# Altium footprint library CONN_HDR_MINI_ST.PcbLib: 116 footprints (part 9 of 10)
Each footprint in its own frame and in the unit in brackets; x right, y up, seen from the top. Pads: shape width x height; smd on the part's side, far side on the other; paste and mask are expansions set on the pad; w line width, h text height; cw(c..) or ccw(c..) is an arc to the next point about the centre after c.
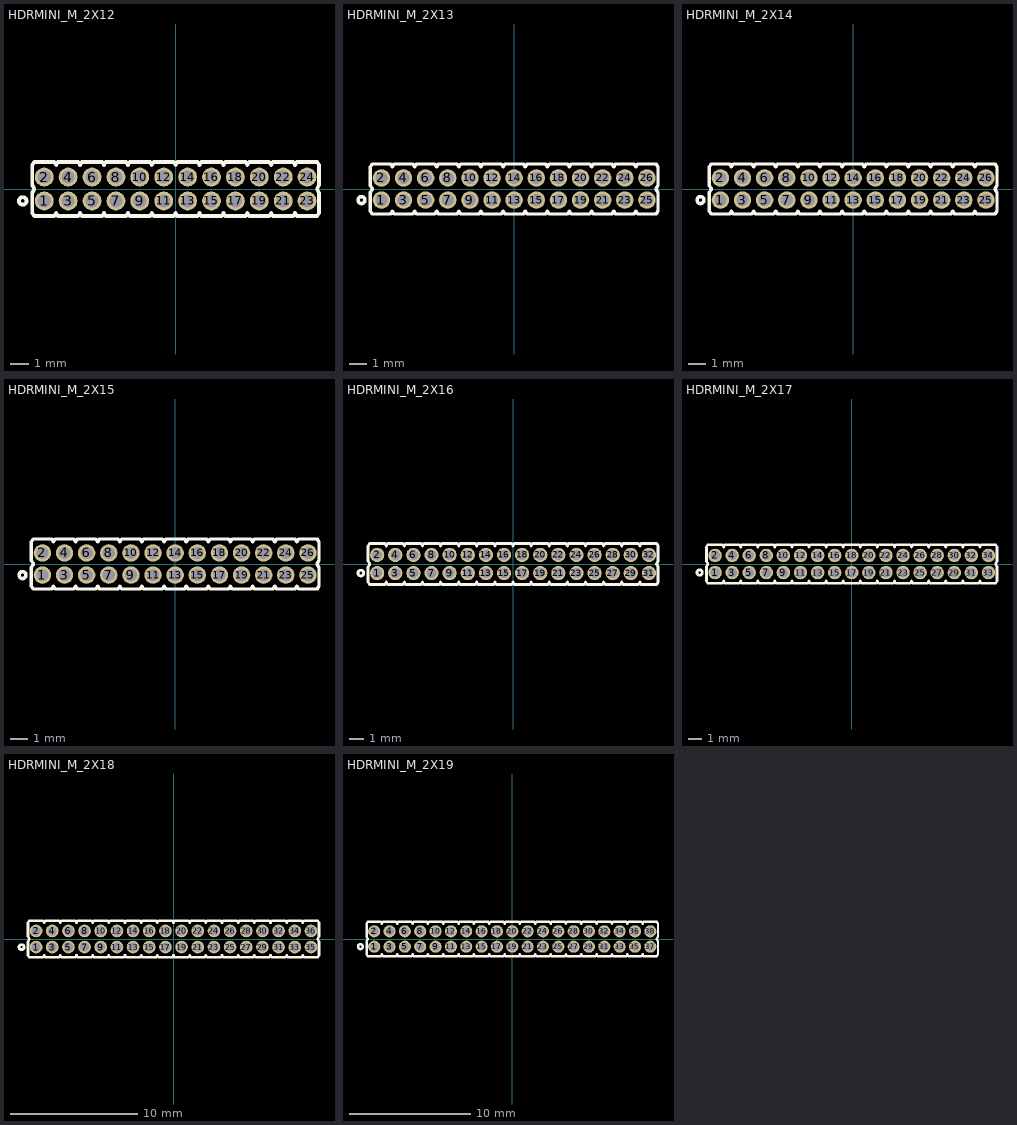
[diagram p8: the footprints below, top view; thin cyan lines are the x and y axes]

## HDRMINI_M_2X12 [mm] "mini header (50mil pitch)"
pads (24):
  round 1 hole 0.7 mask+0.05: 1(-6.985,-0.635) 2(-6.985,0.635) 3(-5.715,-0.635) 4(-5.715,0.635) 5(-4.445,-0.635) 6(-4.445,0.635) 7(-3.175,-0.635) 8(-3.175,0.635) 9(-1.905,-0.635) 10(-1.905,0.635) 11(-0.635,-0.635) 12(-0.635,0.635) 13(0.635,-0.635) 14(0.635,0.635) 15(1.905,-0.635) 16(1.905,0.635) 17(3.175,-0.635) 18(3.175,0.635) 19(4.445,-0.635) 20(4.445,0.635) 21(5.715,-0.635) 22(5.715,0.635) 23(6.985,-0.635) 24(6.985,0.635)
Top Overlay:
  circle w0.2: c-8.128,-0.635 r0.2
  lines w0.2: -7.521,-0.035 -7.62,-0.2 -7.62,-1.27 -7.521,-1.435 -6.449,-1.435 -6.35,-1.27 -6.251,-1.435 -5.179,-1.435 -5.08,-1.27 -4.981,-1.435 -3.909,-1.435 -3.81,-1.27 -3.711,-1.435 -2.639,-1.435 -2.54,-1.27 -2.441,-1.435 -1.369,-1.435 -1.27,-1.27 -1.171,-1.435 -0.099,-1.435 0,-1.27 0.099,-1.435 1.171,-1.435 1.27,-1.27 1.369,-1.435 2.441,-1.435 2.54,-1.27 2.639,-1.435 3.711,-1.435 3.81,-1.27 3.909,-1.435 4.981,-1.435 5.08,-1.27 5.179,-1.435 6.251,-1.435 6.35,-1.27 6.449,-1.435 7.521,-1.435 7.62,-1.27 7.62,-0.2 7.521,-0.035 ; -7.521,0.035 -7.62,0.2 -7.62,1.27 -7.521,1.435 -6.449,1.435 -6.35,1.27 -6.251,1.435 -5.179,1.435 -5.08,1.27 -4.981,1.435 -3.909,1.435 -3.81,1.27 -3.711,1.435 -2.639,1.435 -2.54,1.27 -2.441,1.435 -1.369,1.435 -1.27,1.27 -1.171,1.435 -0.099,1.435 0,1.27 0.099,1.435 1.171,1.435 1.27,1.27 1.369,1.435 2.441,1.435 2.54,1.27 2.639,1.435 3.711,1.435 3.81,1.27 3.909,1.435 4.981,1.435 5.08,1.27 5.179,1.435 6.251,1.435 6.35,1.27 6.449,1.435 7.521,1.435 7.62,1.27 7.62,0.2 7.521,0.035
3D body: height 7.3, standoff -2.5, extent -7.185,0.435 -6.785,0.835
3D body: height 2.8, standoff 0, extent -7.62,0 -6.35,1.27
3D body: height 7.3, standoff -2.5, extent -5.915,0.435 -5.515,0.835
3D body: height 2.8, standoff 0, extent -6.35,0 -5.08,1.27
3D body: height 7.3, standoff -2.5, extent -7.185,-0.835 -6.785,-0.435
3D body: height 2.8, standoff 0, extent -7.62,-1.27 -6.35,0
3D body: height 7.3, standoff -2.5, extent -5.915,-0.835 -5.515,-0.435
3D body: height 2.8, standoff 0, extent -6.35,-1.27 -5.08,0
3D body: height 7.3, standoff -2.5, extent -4.645,0.435 -4.245,0.835
3D body: height 2.8, standoff 0, extent -5.08,0 -3.81,1.27
3D body: height 7.3, standoff -2.5, extent -3.375,0.435 -2.975,0.835
3D body: height 2.8, standoff 0, extent -3.81,0 -2.54,1.27
3D body: height 7.3, standoff -2.5, extent -4.645,-0.835 -4.245,-0.435
3D body: height 2.8, standoff 0, extent -5.08,-1.27 -3.81,0
3D body: height 7.3, standoff -2.5, extent -3.375,-0.835 -2.975,-0.435
3D body: height 2.8, standoff 0, extent -3.81,-1.27 -2.54,0
3D body: height 7.3, standoff -2.5, extent -2.105,0.435 -1.705,0.835
3D body: height 2.8, standoff 0, extent -2.54,0 -1.27,1.27
3D body: height 7.3, standoff -2.5, extent -0.835,0.435 -0.435,0.835
3D body: height 2.8, standoff 0, extent -1.27,0 0,1.27
3D body: height 7.3, standoff -2.5, extent -2.105,-0.835 -1.705,-0.435
3D body: height 2.8, standoff 0, extent -2.54,-1.27 -1.27,0
3D body: height 7.3, standoff -2.5, extent -0.835,-0.835 -0.435,-0.435
3D body: height 2.8, standoff 0, extent -1.27,-1.27 0,0
3D body: height 7.3, standoff -2.5, extent 0.435,0.435 0.835,0.835
3D body: height 2.8, standoff 0, extent 0,0 1.27,1.27
3D body: height 7.3, standoff -2.5, extent 1.705,0.435 2.105,0.835
3D body: height 2.8, standoff 0, extent 1.27,0 2.54,1.27
3D body: height 7.3, standoff -2.5, extent 0.435,-0.835 0.835,-0.435
3D body: height 2.8, standoff 0, extent 0,-1.27 1.27,0
3D body: height 7.3, standoff -2.5, extent 1.705,-0.835 2.105,-0.435
3D body: height 2.8, standoff 0, extent 1.27,-1.27 2.54,0
3D body: height 7.3, standoff -2.5, extent 2.975,0.435 3.375,0.835
3D body: height 2.8, standoff 0, extent 2.54,0 3.81,1.27
3D body: height 7.3, standoff -2.5, extent 4.245,0.435 4.645,0.835
3D body: height 2.8, standoff 0, extent 3.81,0 5.08,1.27
3D body: height 7.3, standoff -2.5, extent 2.975,-0.835 3.375,-0.435
3D body: height 2.8, standoff 0, extent 2.54,-1.27 3.81,0
3D body: height 7.3, standoff -2.5, extent 4.245,-0.835 4.645,-0.435
3D body: height 2.8, standoff 0, extent 3.81,-1.27 5.08,0
3D body: height 7.3, standoff -2.5, extent 5.515,0.435 5.915,0.835
3D body: height 2.8, standoff 0, extent 5.08,0 6.35,1.27
3D body: height 7.3, standoff -2.5, extent 6.785,0.435 7.185,0.835
3D body: height 2.8, standoff 0, extent 6.35,0 7.62,1.27
3D body: height 7.3, standoff -2.5, extent 5.515,-0.835 5.915,-0.435
3D body: height 2.8, standoff 0, extent 5.08,-1.27 6.35,0
3D body: height 7.3, standoff -2.5, extent 6.785,-0.835 7.185,-0.435
3D body: height 2.8, standoff 0, extent 6.35,-1.27 7.62,0

## HDRMINI_M_2X13 [mm] "mini header (50mil pitch)"
pads (26):
  round 1 hole 0.7 mask+0.05: 1(-7.62,-0.635) 2(-7.62,0.635) 3(-6.35,-0.635) 4(-6.35,0.635) 5(-5.08,-0.635) 6(-5.08,0.635) 7(-3.81,-0.635) 8(-3.81,0.635) 9(-2.54,-0.635) 10(-2.54,0.635) 11(-1.27,-0.635) 12(-1.27,0.635) 13(0,-0.635) 14(0,0.635) 15(1.27,-0.635) 16(1.27,0.635) 17(2.54,-0.635) 18(2.54,0.635) 19(3.81,-0.635) 20(3.81,0.635) 21(5.08,-0.635) 22(5.08,0.635) 23(6.35,-0.635) 24(6.35,0.635) 25(7.62,-0.635) 26(7.62,0.635)
Top Overlay:
  circle w0.2: c-8.763,-0.635 r0.2
  lines w0.2: -8.156,-0.035 -8.255,-0.2 -8.255,-1.27 -8.156,-1.435 -7.084,-1.435 -6.985,-1.27 -6.886,-1.435 -5.814,-1.435 -5.715,-1.27 -5.616,-1.435 -4.544,-1.435 -4.445,-1.27 -4.346,-1.435 -3.274,-1.435 -3.175,-1.27 -3.076,-1.435 -2.004,-1.435 -1.905,-1.27 -1.806,-1.435 -0.734,-1.435 -0.635,-1.27 -0.536,-1.435 0.536,-1.435 0.635,-1.27 0.734,-1.435 1.806,-1.435 1.905,-1.27 2.004,-1.435 3.076,-1.435 3.175,-1.27 3.274,-1.435 4.346,-1.435 4.445,-1.27 4.544,-1.435 5.616,-1.435 5.715,-1.27 5.814,-1.435 6.886,-1.435 6.985,-1.27 7.084,-1.435 8.156,-1.435 8.255,-1.27 8.255,-0.2 8.156,-0.035 ; -8.156,0.035 -8.255,0.2 -8.255,1.27 -8.156,1.435 -7.084,1.435 -6.985,1.27 -6.886,1.435 -5.814,1.435 -5.715,1.27 -5.616,1.435 -4.544,1.435 -4.445,1.27 -4.346,1.435 -3.274,1.435 -3.175,1.27 -3.076,1.435 -2.004,1.435 -1.905,1.27 -1.806,1.435 -0.734,1.435 -0.635,1.27 -0.536,1.435 0.536,1.435 0.635,1.27 0.734,1.435 1.806,1.435 1.905,1.27 2.004,1.435 3.076,1.435 3.175,1.27 3.274,1.435 4.346,1.435 4.445,1.27 4.544,1.435 5.616,1.435 5.715,1.27 5.814,1.435 6.886,1.435 6.985,1.27 7.084,1.435 8.156,1.435 8.255,1.27 8.255,0.2 8.156,0.035
3D body: height 7.3, standoff -2.5, extent -7.82,0.435 -7.42,0.835
3D body: height 2.8, standoff 0, extent -8.255,0 -6.985,1.27
3D body: height 7.3, standoff -2.5, extent -6.55,0.435 -6.15,0.835
3D body: height 2.8, standoff 0, extent -6.985,0 -5.715,1.27
3D body: height 7.3, standoff -2.5, extent -7.82,-0.835 -7.42,-0.435
3D body: height 2.8, standoff 0, extent -8.255,-1.27 -6.985,0
3D body: height 7.3, standoff -2.5, extent -6.55,-0.835 -6.15,-0.435
3D body: height 2.8, standoff 0, extent -6.985,-1.27 -5.715,0
3D body: height 7.3, standoff -2.5, extent -5.28,0.435 -4.88,0.835
3D body: height 2.8, standoff 0, extent -5.715,0 -4.445,1.27
3D body: height 7.3, standoff -2.5, extent -4.01,0.435 -3.61,0.835
3D body: height 2.8, standoff 0, extent -4.445,0 -3.175,1.27
3D body: height 7.3, standoff -2.5, extent -5.28,-0.835 -4.88,-0.435
3D body: height 2.8, standoff 0, extent -5.715,-1.27 -4.445,0
3D body: height 7.3, standoff -2.5, extent -4.01,-0.835 -3.61,-0.435
3D body: height 2.8, standoff 0, extent -4.445,-1.27 -3.175,0
3D body: height 7.3, standoff -2.5, extent -2.74,0.435 -2.34,0.835
3D body: height 2.8, standoff 0, extent -3.175,0 -1.905,1.27
3D body: height 7.3, standoff -2.5, extent -1.47,0.435 -1.07,0.835
3D body: height 2.8, standoff 0, extent -1.905,0 -0.635,1.27
3D body: height 7.3, standoff -2.5, extent -2.74,-0.835 -2.34,-0.435
3D body: height 2.8, standoff 0, extent -3.175,-1.27 -1.905,0
3D body: height 7.3, standoff -2.5, extent -1.47,-0.835 -1.07,-0.435
3D body: height 2.8, standoff 0, extent -1.905,-1.27 -0.635,0
3D body: height 7.3, standoff -2.5, extent -0.2,0.435 0.2,0.835
3D body: height 2.8, standoff 0, extent -0.635,0 0.635,1.27
3D body: height 7.3, standoff -2.5, extent 1.07,0.435 1.47,0.835
3D body: height 2.8, standoff 0, extent 0.635,0 1.905,1.27
3D body: height 7.3, standoff -2.5, extent -0.2,-0.835 0.2,-0.435
3D body: height 2.8, standoff 0, extent -0.635,-1.27 0.635,0
3D body: height 7.3, standoff -2.5, extent 1.07,-0.835 1.47,-0.435
3D body: height 2.8, standoff 0, extent 0.635,-1.27 1.905,0
3D body: height 7.3, standoff -2.5, extent 2.34,0.435 2.74,0.835
3D body: height 2.8, standoff 0, extent 1.905,0 3.175,1.27
3D body: height 7.3, standoff -2.5, extent 3.61,0.435 4.01,0.835
3D body: height 2.8, standoff 0, extent 3.175,0 4.445,1.27
3D body: height 7.3, standoff -2.5, extent 2.34,-0.835 2.74,-0.435
3D body: height 2.8, standoff 0, extent 1.905,-1.27 3.175,0
3D body: height 7.3, standoff -2.5, extent 3.61,-0.835 4.01,-0.435
3D body: height 2.8, standoff 0, extent 3.175,-1.27 4.445,0
3D body: height 7.3, standoff -2.5, extent 4.88,0.435 5.28,0.835
3D body: height 2.8, standoff 0, extent 4.445,0 5.715,1.27
3D body: height 7.3, standoff -2.5, extent 6.15,0.435 6.55,0.835
3D body: height 2.8, standoff 0, extent 5.715,0 6.985,1.27
3D body: height 7.3, standoff -2.5, extent 4.88,-0.835 5.28,-0.435
3D body: height 2.8, standoff 0, extent 4.445,-1.27 5.715,0
3D body: height 7.3, standoff -2.5, extent 6.15,-0.835 6.55,-0.435
3D body: height 2.8, standoff 0, extent 5.715,-1.27 6.985,0
3D body: height 7.3, standoff -2.5, extent 7.42,0.435 7.82,0.835
3D body: height 2.8, standoff 0, extent 6.985,0 8.255,1.27
3D body: height 7.3, standoff -2.5, extent 7.42,-0.835 7.82,-0.435
3D body: height 2.8, standoff 0, extent 6.985,-1.27 8.255,0

## HDRMINI_M_2X14 [mm] "mini header (50mil pitch)"
pads (26):
  round 1 hole 0.7 mask+0.05: 1(-7.62,-0.635) 2(-7.62,0.635) 3(-6.35,-0.635) 4(-6.35,0.635) 5(-5.08,-0.635) 6(-5.08,0.635) 7(-3.81,-0.635) 8(-3.81,0.635) 9(-2.54,-0.635) 10(-2.54,0.635) 11(-1.27,-0.635) 12(-1.27,0.635) 13(0,-0.635) 14(0,0.635) 15(1.27,-0.635) 16(1.27,0.635) 17(2.54,-0.635) 18(2.54,0.635) 19(3.81,-0.635) 20(3.81,0.635) 21(5.08,-0.635) 22(5.08,0.635) 23(6.35,-0.635) 24(6.35,0.635) 25(7.62,-0.635) 26(7.62,0.635)
Top Overlay:
  circle w0.2: c-8.763,-0.635 r0.2
  lines w0.2: -8.156,-0.035 -8.255,-0.2 -8.255,-1.27 -8.156,-1.435 -7.084,-1.435 -6.985,-1.27 -6.886,-1.435 -5.814,-1.435 -5.715,-1.27 -5.616,-1.435 -4.544,-1.435 -4.445,-1.27 -4.346,-1.435 -3.274,-1.435 -3.175,-1.27 -3.076,-1.435 -2.004,-1.435 -1.905,-1.27 -1.806,-1.435 -0.734,-1.435 -0.635,-1.27 -0.536,-1.435 0.536,-1.435 0.635,-1.27 0.734,-1.435 1.806,-1.435 1.905,-1.27 2.004,-1.435 3.076,-1.435 3.175,-1.27 3.274,-1.435 4.346,-1.435 4.445,-1.27 4.544,-1.435 5.616,-1.435 5.715,-1.27 5.814,-1.435 6.886,-1.435 6.985,-1.27 7.084,-1.435 8.156,-1.435 8.255,-1.27 8.255,-0.2 8.156,-0.035 ; -8.156,0.035 -8.255,0.2 -8.255,1.27 -8.156,1.435 -7.084,1.435 -6.985,1.27 -6.886,1.435 -5.814,1.435 -5.715,1.27 -5.616,1.435 -4.544,1.435 -4.445,1.27 -4.346,1.435 -3.274,1.435 -3.175,1.27 -3.076,1.435 -2.004,1.435 -1.905,1.27 -1.806,1.435 -0.734,1.435 -0.635,1.27 -0.536,1.435 0.536,1.435 0.635,1.27 0.734,1.435 1.806,1.435 1.905,1.27 2.004,1.435 3.076,1.435 3.175,1.27 3.274,1.435 4.346,1.435 4.445,1.27 4.544,1.435 5.616,1.435 5.715,1.27 5.814,1.435 6.886,1.435 6.985,1.27 7.084,1.435 8.156,1.435 8.255,1.27 8.255,0.2 8.156,0.035
3D body: height 7.3, standoff -2.5, extent -7.82,0.435 -7.42,0.835
3D body: height 2.8, standoff 0, extent -8.255,0 -6.985,1.27
3D body: height 7.3, standoff -2.5, extent -6.55,0.435 -6.15,0.835
3D body: height 2.8, standoff 0, extent -6.985,0 -5.715,1.27
3D body: height 7.3, standoff -2.5, extent -7.82,-0.835 -7.42,-0.435
3D body: height 2.8, standoff 0, extent -8.255,-1.27 -6.985,0
3D body: height 7.3, standoff -2.5, extent -6.55,-0.835 -6.15,-0.435
3D body: height 2.8, standoff 0, extent -6.985,-1.27 -5.715,0
3D body: height 7.3, standoff -2.5, extent -5.28,0.435 -4.88,0.835
3D body: height 2.8, standoff 0, extent -5.715,0 -4.445,1.27
3D body: height 7.3, standoff -2.5, extent -4.01,0.435 -3.61,0.835
3D body: height 2.8, standoff 0, extent -4.445,0 -3.175,1.27
3D body: height 7.3, standoff -2.5, extent -5.28,-0.835 -4.88,-0.435
3D body: height 2.8, standoff 0, extent -5.715,-1.27 -4.445,0
3D body: height 7.3, standoff -2.5, extent -4.01,-0.835 -3.61,-0.435
3D body: height 2.8, standoff 0, extent -4.445,-1.27 -3.175,0
3D body: height 7.3, standoff -2.5, extent -2.74,0.435 -2.34,0.835
3D body: height 2.8, standoff 0, extent -3.175,0 -1.905,1.27
3D body: height 7.3, standoff -2.5, extent -1.47,0.435 -1.07,0.835
3D body: height 2.8, standoff 0, extent -1.905,0 -0.635,1.27
3D body: height 7.3, standoff -2.5, extent -2.74,-0.835 -2.34,-0.435
3D body: height 2.8, standoff 0, extent -3.175,-1.27 -1.905,0
3D body: height 7.3, standoff -2.5, extent -1.47,-0.835 -1.07,-0.435
3D body: height 2.8, standoff 0, extent -1.905,-1.27 -0.635,0
3D body: height 7.3, standoff -2.5, extent -0.2,0.435 0.2,0.835
3D body: height 2.8, standoff 0, extent -0.635,0 0.635,1.27
3D body: height 7.3, standoff -2.5, extent 1.07,0.435 1.47,0.835
3D body: height 2.8, standoff 0, extent 0.635,0 1.905,1.27
3D body: height 7.3, standoff -2.5, extent -0.2,-0.835 0.2,-0.435
3D body: height 2.8, standoff 0, extent -0.635,-1.27 0.635,0
3D body: height 7.3, standoff -2.5, extent 1.07,-0.835 1.47,-0.435
3D body: height 2.8, standoff 0, extent 0.635,-1.27 1.905,0
3D body: height 7.3, standoff -2.5, extent 2.34,0.435 2.74,0.835
3D body: height 2.8, standoff 0, extent 1.905,0 3.175,1.27
3D body: height 7.3, standoff -2.5, extent 3.61,0.435 4.01,0.835
3D body: height 2.8, standoff 0, extent 3.175,0 4.445,1.27
3D body: height 7.3, standoff -2.5, extent 2.34,-0.835 2.74,-0.435
3D body: height 2.8, standoff 0, extent 1.905,-1.27 3.175,0
3D body: height 7.3, standoff -2.5, extent 3.61,-0.835 4.01,-0.435
3D body: height 2.8, standoff 0, extent 3.175,-1.27 4.445,0
3D body: height 7.3, standoff -2.5, extent 4.88,0.435 5.28,0.835
3D body: height 2.8, standoff 0, extent 4.445,0 5.715,1.27
3D body: height 7.3, standoff -2.5, extent 6.15,0.435 6.55,0.835
3D body: height 2.8, standoff 0, extent 5.715,0 6.985,1.27
3D body: height 7.3, standoff -2.5, extent 4.88,-0.835 5.28,-0.435
3D body: height 2.8, standoff 0, extent 4.445,-1.27 5.715,0
3D body: height 7.3, standoff -2.5, extent 6.15,-0.835 6.55,-0.435
3D body: height 2.8, standoff 0, extent 5.715,-1.27 6.985,0
3D body: height 7.3, standoff -2.5, extent 7.42,0.435 7.82,0.835
3D body: height 2.8, standoff 0, extent 6.985,0 8.255,1.27
3D body: height 7.3, standoff -2.5, extent 7.42,-0.835 7.82,-0.435
3D body: height 2.8, standoff 0, extent 6.985,-1.27 8.255,0

## HDRMINI_M_2X15 [mm] "mini header (50mil pitch)"
pads (26):
  round 1 hole 0.7 mask+0.05: 1(-7.62,-0.635) 2(-7.62,0.635) 3(-6.35,-0.635) 4(-6.35,0.635) 5(-5.08,-0.635) 6(-5.08,0.635) 7(-3.81,-0.635) 8(-3.81,0.635) 9(-2.54,-0.635) 10(-2.54,0.635) 11(-1.27,-0.635) 12(-1.27,0.635) 13(0,-0.635) 14(0,0.635) 15(1.27,-0.635) 16(1.27,0.635) 17(2.54,-0.635) 18(2.54,0.635) 19(3.81,-0.635) 20(3.81,0.635) 21(5.08,-0.635) 22(5.08,0.635) 23(6.35,-0.635) 24(6.35,0.635) 25(7.62,-0.635) 26(7.62,0.635)
Top Overlay:
  circle w0.2: c-8.763,-0.635 r0.2
  lines w0.2: -8.156,-0.035 -8.255,-0.2 -8.255,-1.27 -8.156,-1.435 -7.084,-1.435 -6.985,-1.27 -6.886,-1.435 -5.814,-1.435 -5.715,-1.27 -5.616,-1.435 -4.544,-1.435 -4.445,-1.27 -4.346,-1.435 -3.274,-1.435 -3.175,-1.27 -3.076,-1.435 -2.004,-1.435 -1.905,-1.27 -1.806,-1.435 -0.734,-1.435 -0.635,-1.27 -0.536,-1.435 0.536,-1.435 0.635,-1.27 0.734,-1.435 1.806,-1.435 1.905,-1.27 2.004,-1.435 3.076,-1.435 3.175,-1.27 3.274,-1.435 4.346,-1.435 4.445,-1.27 4.544,-1.435 5.616,-1.435 5.715,-1.27 5.814,-1.435 6.886,-1.435 6.985,-1.27 7.084,-1.435 8.156,-1.435 8.255,-1.27 8.255,-0.2 8.156,-0.035 ; -8.156,0.035 -8.255,0.2 -8.255,1.27 -8.156,1.435 -7.084,1.435 -6.985,1.27 -6.886,1.435 -5.814,1.435 -5.715,1.27 -5.616,1.435 -4.544,1.435 -4.445,1.27 -4.346,1.435 -3.274,1.435 -3.175,1.27 -3.076,1.435 -2.004,1.435 -1.905,1.27 -1.806,1.435 -0.734,1.435 -0.635,1.27 -0.536,1.435 0.536,1.435 0.635,1.27 0.734,1.435 1.806,1.435 1.905,1.27 2.004,1.435 3.076,1.435 3.175,1.27 3.274,1.435 4.346,1.435 4.445,1.27 4.544,1.435 5.616,1.435 5.715,1.27 5.814,1.435 6.886,1.435 6.985,1.27 7.084,1.435 8.156,1.435 8.255,1.27 8.255,0.2 8.156,0.035
3D body: height 7.3, standoff -2.5, extent -7.82,0.435 -7.42,0.835
3D body: height 2.8, standoff 0, extent -8.255,0 -6.985,1.27
3D body: height 7.3, standoff -2.5, extent -6.55,0.435 -6.15,0.835
3D body: height 2.8, standoff 0, extent -6.985,0 -5.715,1.27
3D body: height 7.3, standoff -2.5, extent -7.82,-0.835 -7.42,-0.435
3D body: height 2.8, standoff 0, extent -8.255,-1.27 -6.985,0
3D body: height 7.3, standoff -2.5, extent -6.55,-0.835 -6.15,-0.435
3D body: height 2.8, standoff 0, extent -6.985,-1.27 -5.715,0
3D body: height 7.3, standoff -2.5, extent -5.28,0.435 -4.88,0.835
3D body: height 2.8, standoff 0, extent -5.715,0 -4.445,1.27
3D body: height 7.3, standoff -2.5, extent -4.01,0.435 -3.61,0.835
3D body: height 2.8, standoff 0, extent -4.445,0 -3.175,1.27
3D body: height 7.3, standoff -2.5, extent -5.28,-0.835 -4.88,-0.435
3D body: height 2.8, standoff 0, extent -5.715,-1.27 -4.445,0
3D body: height 7.3, standoff -2.5, extent -4.01,-0.835 -3.61,-0.435
3D body: height 2.8, standoff 0, extent -4.445,-1.27 -3.175,0
3D body: height 7.3, standoff -2.5, extent -2.74,0.435 -2.34,0.835
3D body: height 2.8, standoff 0, extent -3.175,0 -1.905,1.27
3D body: height 7.3, standoff -2.5, extent -1.47,0.435 -1.07,0.835
3D body: height 2.8, standoff 0, extent -1.905,0 -0.635,1.27
3D body: height 7.3, standoff -2.5, extent -2.74,-0.835 -2.34,-0.435
3D body: height 2.8, standoff 0, extent -3.175,-1.27 -1.905,0
3D body: height 7.3, standoff -2.5, extent -1.47,-0.835 -1.07,-0.435
3D body: height 2.8, standoff 0, extent -1.905,-1.27 -0.635,0
3D body: height 7.3, standoff -2.5, extent -0.2,0.435 0.2,0.835
3D body: height 2.8, standoff 0, extent -0.635,0 0.635,1.27
3D body: height 7.3, standoff -2.5, extent 1.07,0.435 1.47,0.835
3D body: height 2.8, standoff 0, extent 0.635,0 1.905,1.27
3D body: height 7.3, standoff -2.5, extent -0.2,-0.835 0.2,-0.435
3D body: height 2.8, standoff 0, extent -0.635,-1.27 0.635,0
3D body: height 7.3, standoff -2.5, extent 1.07,-0.835 1.47,-0.435
3D body: height 2.8, standoff 0, extent 0.635,-1.27 1.905,0
3D body: height 7.3, standoff -2.5, extent 2.34,0.435 2.74,0.835
3D body: height 2.8, standoff 0, extent 1.905,0 3.175,1.27
3D body: height 7.3, standoff -2.5, extent 3.61,0.435 4.01,0.835
3D body: height 2.8, standoff 0, extent 3.175,0 4.445,1.27
3D body: height 7.3, standoff -2.5, extent 2.34,-0.835 2.74,-0.435
3D body: height 2.8, standoff 0, extent 1.905,-1.27 3.175,0
3D body: height 7.3, standoff -2.5, extent 3.61,-0.835 4.01,-0.435
3D body: height 2.8, standoff 0, extent 3.175,-1.27 4.445,0
3D body: height 7.3, standoff -2.5, extent 4.88,0.435 5.28,0.835
3D body: height 2.8, standoff 0, extent 4.445,0 5.715,1.27
3D body: height 7.3, standoff -2.5, extent 6.15,0.435 6.55,0.835
3D body: height 2.8, standoff 0, extent 5.715,0 6.985,1.27
3D body: height 7.3, standoff -2.5, extent 4.88,-0.835 5.28,-0.435
3D body: height 2.8, standoff 0, extent 4.445,-1.27 5.715,0
3D body: height 7.3, standoff -2.5, extent 6.15,-0.835 6.55,-0.435
3D body: height 2.8, standoff 0, extent 5.715,-1.27 6.985,0
3D body: height 7.3, standoff -2.5, extent 7.42,0.435 7.82,0.835
3D body: height 2.8, standoff 0, extent 6.985,0 8.255,1.27
3D body: height 7.3, standoff -2.5, extent 7.42,-0.835 7.82,-0.435
3D body: height 2.8, standoff 0, extent 6.985,-1.27 8.255,0

## HDRMINI_M_2X16 [mm] "mini header (50mil pitch)"
pads (32):
  round 1 hole 0.7 mask+0.05: 1(-9.525,-0.635) 2(-9.525,0.635) 3(-8.255,-0.635) 4(-8.255,0.635) 5(-6.985,-0.635) 6(-6.985,0.635) 7(-5.715,-0.635) 8(-5.715,0.635) 9(-4.445,-0.635) 10(-4.445,0.635) 11(-3.175,-0.635) 12(-3.175,0.635) 13(-1.905,-0.635) 14(-1.905,0.635) 15(-0.635,-0.635) 16(-0.635,0.635) 17(0.635,-0.635) 18(0.635,0.635) 19(1.905,-0.635) 20(1.905,0.635) 21(3.175,-0.635) 22(3.175,0.635) 23(4.445,-0.635) 24(4.445,0.635) 25(5.715,-0.635) 26(5.715,0.635) 27(6.985,-0.635) 28(6.985,0.635) 29(8.255,-0.635) 30(8.255,0.635) 31(9.525,-0.635) 32(9.525,0.635)
Top Overlay:
  circle w0.2: c-10.668,-0.635 r0.2
  lines w0.2: -10.061,-0.035 -10.16,-0.2 -10.16,-1.27 -10.061,-1.435 -8.989,-1.435 -8.89,-1.27 -8.791,-1.435 -7.719,-1.435 -7.62,-1.27 -7.521,-1.435 -6.449,-1.435 -6.35,-1.27 -6.251,-1.435 -5.179,-1.435 -5.08,-1.27 -4.981,-1.435 -3.909,-1.435 -3.81,-1.27 -3.711,-1.435 -2.639,-1.435 -2.54,-1.27 -2.441,-1.435 -1.369,-1.435 -1.27,-1.27 -1.171,-1.435 -0.099,-1.435 0,-1.27 0.099,-1.435 1.171,-1.435 1.27,-1.27 1.369,-1.435 2.441,-1.435 2.54,-1.27 2.639,-1.435 3.711,-1.435 3.81,-1.27 3.909,-1.435 4.981,-1.435 5.08,-1.27 5.179,-1.435 6.251,-1.435 6.35,-1.27 6.449,-1.435 7.521,-1.435 7.62,-1.27 7.719,-1.435 8.791,-1.435 8.89,-1.27 8.989,-1.435 10.061,-1.435 10.16,-1.27 10.16,-0.2 10.061,-0.035 ; -10.061,0.035 -10.16,0.2 -10.16,1.27 -10.061,1.435 -8.989,1.435 -8.89,1.27 -8.791,1.435 -7.719,1.435 -7.62,1.27 -7.521,1.435 -6.449,1.435 -6.35,1.27 -6.251,1.435 -5.179,1.435 -5.08,1.27 -4.981,1.435 -3.909,1.435 -3.81,1.27 -3.711,1.435 -2.639,1.435 -2.54,1.27 -2.441,1.435 -1.369,1.435 -1.27,1.27 -1.171,1.435 -0.099,1.435 0,1.27 0.099,1.435 1.171,1.435 1.27,1.27 1.369,1.435 2.441,1.435 2.54,1.27 2.639,1.435 3.711,1.435 3.81,1.27 3.909,1.435 4.981,1.435 5.08,1.27 5.179,1.435 6.251,1.435 6.35,1.27 6.449,1.435 7.521,1.435 7.62,1.27 7.719,1.435 8.791,1.435 8.89,1.27 8.989,1.435 10.061,1.435 10.16,1.27 10.16,0.2 10.061,0.035
3D body: height 2.8, standoff 0, extent 8.89,-1.27 10.16,0
3D body: height 7.3, standoff -2.5, extent 9.325,-0.835 9.725,-0.435
3D body: height 2.8, standoff 0, extent 7.62,-1.27 8.89,0
3D body: height 7.3, standoff -2.5, extent 8.055,-0.835 8.455,-0.435
3D body: height 2.8, standoff 0, extent 8.89,0 10.16,1.27
3D body: height 7.3, standoff -2.5, extent 9.325,0.435 9.725,0.835
3D body: height 2.8, standoff 0, extent 7.62,0 8.89,1.27
3D body: height 7.3, standoff -2.5, extent 8.055,0.435 8.455,0.835
3D body: height 2.8, standoff 0, extent 6.35,-1.27 7.62,0
3D body: height 7.3, standoff -2.5, extent 6.785,-0.835 7.185,-0.435
3D body: height 2.8, standoff 0, extent 5.08,-1.27 6.35,0
3D body: height 7.3, standoff -2.5, extent 5.515,-0.835 5.915,-0.435
3D body: height 2.8, standoff 0, extent 6.35,0 7.62,1.27
3D body: height 7.3, standoff -2.5, extent 6.785,0.435 7.185,0.835
3D body: height 2.8, standoff 0, extent 5.08,0 6.35,1.27
3D body: height 7.3, standoff -2.5, extent 5.515,0.435 5.915,0.835
3D body: height 2.8, standoff 0, extent 3.81,-1.27 5.08,0
3D body: height 7.3, standoff -2.5, extent 4.245,-0.835 4.645,-0.435
3D body: height 2.8, standoff 0, extent 2.54,-1.27 3.81,0
3D body: height 7.3, standoff -2.5, extent 2.975,-0.835 3.375,-0.435
3D body: height 2.8, standoff 0, extent 3.81,0 5.08,1.27
3D body: height 7.3, standoff -2.5, extent 4.245,0.435 4.645,0.835
3D body: height 2.8, standoff 0, extent 2.54,0 3.81,1.27
3D body: height 7.3, standoff -2.5, extent 2.975,0.435 3.375,0.835
3D body: height 2.8, standoff 0, extent 1.27,-1.27 2.54,0
3D body: height 7.3, standoff -2.5, extent 1.705,-0.835 2.105,-0.435
3D body: height 2.8, standoff 0, extent 0,-1.27 1.27,0
3D body: height 7.3, standoff -2.5, extent 0.435,-0.835 0.835,-0.435
3D body: height 2.8, standoff 0, extent 1.27,0 2.54,1.27
3D body: height 7.3, standoff -2.5, extent 1.705,0.435 2.105,0.835
3D body: height 2.8, standoff 0, extent 0,0 1.27,1.27
3D body: height 7.3, standoff -2.5, extent 0.435,0.435 0.835,0.835
3D body: height 2.8, standoff 0, extent -1.27,-1.27 0,0
3D body: height 7.3, standoff -2.5, extent -0.835,-0.835 -0.435,-0.435
3D body: height 2.8, standoff 0, extent -2.54,-1.27 -1.27,0
3D body: height 7.3, standoff -2.5, extent -2.105,-0.835 -1.705,-0.435
3D body: height 2.8, standoff 0, extent -1.27,0 0,1.27
3D body: height 7.3, standoff -2.5, extent -0.835,0.435 -0.435,0.835
3D body: height 2.8, standoff 0, extent -2.54,0 -1.27,1.27
3D body: height 7.3, standoff -2.5, extent -2.105,0.435 -1.705,0.835
3D body: height 2.8, standoff 0, extent -3.81,-1.27 -2.54,0
3D body: height 7.3, standoff -2.5, extent -3.375,-0.835 -2.975,-0.435
3D body: height 2.8, standoff 0, extent -5.08,-1.27 -3.81,0
3D body: height 7.3, standoff -2.5, extent -4.645,-0.835 -4.245,-0.435
3D body: height 2.8, standoff 0, extent -3.81,0 -2.54,1.27
3D body: height 7.3, standoff -2.5, extent -3.375,0.435 -2.975,0.835
3D body: height 2.8, standoff 0, extent -5.08,0 -3.81,1.27
3D body: height 7.3, standoff -2.5, extent -4.645,0.435 -4.245,0.835
3D body: height 2.8, standoff 0, extent -6.35,-1.27 -5.08,0
3D body: height 7.3, standoff -2.5, extent -5.915,-0.835 -5.515,-0.435
3D body: height 2.8, standoff 0, extent -7.62,-1.27 -6.35,0
3D body: height 7.3, standoff -2.5, extent -7.185,-0.835 -6.785,-0.435
3D body: height 2.8, standoff 0, extent -6.35,0 -5.08,1.27
3D body: height 7.3, standoff -2.5, extent -5.915,0.435 -5.515,0.835
3D body: height 2.8, standoff 0, extent -7.62,0 -6.35,1.27
3D body: height 7.3, standoff -2.5, extent -7.185,0.435 -6.785,0.835
3D body: height 2.8, standoff 0, extent -8.89,-1.27 -7.62,0
3D body: height 7.3, standoff -2.5, extent -8.455,-0.835 -8.055,-0.435
3D body: height 2.8, standoff 0, extent -10.16,-1.27 -8.89,0
3D body: height 7.3, standoff -2.5, extent -9.725,-0.835 -9.325,-0.435
3D body: height 2.8, standoff 0, extent -8.89,0 -7.62,1.27
3D body: height 7.3, standoff -2.5, extent -8.455,0.435 -8.055,0.835
3D body: height 2.8, standoff 0, extent -10.16,0 -8.89,1.27
3D body: height 7.3, standoff -2.5, extent -9.725,0.435 -9.325,0.835

## HDRMINI_M_2X17 [mm] "mini header (50mil pitch)"
pads (34):
  round 1 hole 0.7 mask+0.05: 1(-10.16,-0.635) 2(-10.16,0.635) 3(-8.89,-0.635) 4(-8.89,0.635) 5(-7.62,-0.635) 6(-7.62,0.635) 7(-6.35,-0.635) 8(-6.35,0.635) 9(-5.08,-0.635) 10(-5.08,0.635) 11(-3.81,-0.635) 12(-3.81,0.635) 13(-2.54,-0.635) 14(-2.54,0.635) 15(-1.27,-0.635) 16(-1.27,0.635) 17(0,-0.635) 18(0,0.635) 19(1.27,-0.635) 20(1.27,0.635) 21(2.54,-0.635) 22(2.54,0.635) 23(3.81,-0.635) 24(3.81,0.635) 25(5.08,-0.635) 26(5.08,0.635) 27(6.35,-0.635) 28(6.35,0.635) 29(7.62,-0.635) 30(7.62,0.635) 31(8.89,-0.635) 32(8.89,0.635) 33(10.16,-0.635) 34(10.16,0.635)
Top Overlay:
  circle w0.2: c-11.303,-0.635 r0.2
  lines w0.2: -10.696,-0.035 -10.795,-0.2 -10.795,-1.27 -10.696,-1.435 -9.624,-1.435 -9.525,-1.27 -9.426,-1.435 -8.354,-1.435 -8.255,-1.27 -8.156,-1.435 -7.084,-1.435 -6.985,-1.27 -6.886,-1.435 -5.814,-1.435 -5.715,-1.27 -5.616,-1.435 -4.544,-1.435 -4.445,-1.27 -4.346,-1.435 -3.274,-1.435 -3.175,-1.27 -3.076,-1.435 -2.004,-1.435 -1.905,-1.27 -1.806,-1.435 -0.734,-1.435 -0.635,-1.27 -0.536,-1.435 0.536,-1.435 0.635,-1.27 0.734,-1.435 1.806,-1.435 1.905,-1.27 2.004,-1.435 3.076,-1.435 3.175,-1.27 3.274,-1.435 4.346,-1.435 4.445,-1.27 4.544,-1.435 5.616,-1.435 5.715,-1.27 5.814,-1.435 6.886,-1.435 6.985,-1.27 7.084,-1.435 8.156,-1.435 8.255,-1.27 8.354,-1.435 9.426,-1.435 9.525,-1.27 9.624,-1.435 10.696,-1.435 10.795,-1.27 10.795,-0.2 10.696,-0.035 ; -10.696,0.035 -10.795,0.2 -10.795,1.27 -10.696,1.435 -9.624,1.435 -9.525,1.27 -9.426,1.435 -8.354,1.435 -8.255,1.27 -8.156,1.435 -7.084,1.435 -6.985,1.27 -6.886,1.435 -5.814,1.435 -5.715,1.27 -5.616,1.435 -4.544,1.435 -4.445,1.27 -4.346,1.435 -3.274,1.435 -3.175,1.27 -3.076,1.435 -2.004,1.435 -1.905,1.27 -1.806,1.435 -0.734,1.435 -0.635,1.27 -0.536,1.435 0.536,1.435 0.635,1.27 0.734,1.435 1.806,1.435 1.905,1.27 2.004,1.435 3.076,1.435 3.175,1.27 3.274,1.435 4.346,1.435 4.445,1.27 4.544,1.435 5.616,1.435 5.715,1.27 5.814,1.435 6.886,1.435 6.985,1.27 7.084,1.435 8.156,1.435 8.255,1.27 8.354,1.435 9.426,1.435 9.525,1.27 9.624,1.435 10.696,1.435 10.795,1.27 10.795,0.2 10.696,0.035
3D body: height 2.8, standoff 0, extent 9.525,-1.27 10.795,0
3D body: height 7.3, standoff -2.5, extent 9.96,-0.835 10.36,-0.435
3D body: height 2.8, standoff 0, extent 9.525,0 10.795,1.27
3D body: height 7.3, standoff -2.5, extent 9.96,0.435 10.36,0.835
3D body: height 2.8, standoff 0, extent 8.255,-1.27 9.525,0
3D body: height 7.3, standoff -2.5, extent 8.69,-0.835 9.09,-0.435
3D body: height 2.8, standoff 0, extent 6.985,-1.27 8.255,0
3D body: height 7.3, standoff -2.5, extent 7.42,-0.835 7.82,-0.435
3D body: height 2.8, standoff 0, extent 8.255,0 9.525,1.27
3D body: height 7.3, standoff -2.5, extent 8.69,0.435 9.09,0.835
3D body: height 2.8, standoff 0, extent 6.985,0 8.255,1.27
3D body: height 7.3, standoff -2.5, extent 7.42,0.435 7.82,0.835
3D body: height 2.8, standoff 0, extent 5.715,-1.27 6.985,0
3D body: height 7.3, standoff -2.5, extent 6.15,-0.835 6.55,-0.435
3D body: height 2.8, standoff 0, extent 4.445,-1.27 5.715,0
3D body: height 7.3, standoff -2.5, extent 4.88,-0.835 5.28,-0.435
3D body: height 2.8, standoff 0, extent 5.715,0 6.985,1.27
3D body: height 7.3, standoff -2.5, extent 6.15,0.435 6.55,0.835
3D body: height 2.8, standoff 0, extent 4.445,0 5.715,1.27
3D body: height 7.3, standoff -2.5, extent 4.88,0.435 5.28,0.835
3D body: height 2.8, standoff 0, extent 3.175,-1.27 4.445,0
3D body: height 7.3, standoff -2.5, extent 3.61,-0.835 4.01,-0.435
3D body: height 2.8, standoff 0, extent 1.905,-1.27 3.175,0
3D body: height 7.3, standoff -2.5, extent 2.34,-0.835 2.74,-0.435
3D body: height 2.8, standoff 0, extent 3.175,0 4.445,1.27
3D body: height 7.3, standoff -2.5, extent 3.61,0.435 4.01,0.835
3D body: height 2.8, standoff 0, extent 1.905,0 3.175,1.27
3D body: height 7.3, standoff -2.5, extent 2.34,0.435 2.74,0.835
3D body: height 2.8, standoff 0, extent 0.635,-1.27 1.905,0
3D body: height 7.3, standoff -2.5, extent 1.07,-0.835 1.47,-0.435
3D body: height 2.8, standoff 0, extent -0.635,-1.27 0.635,0
3D body: height 7.3, standoff -2.5, extent -0.2,-0.835 0.2,-0.435
3D body: height 2.8, standoff 0, extent 0.635,0 1.905,1.27
3D body: height 7.3, standoff -2.5, extent 1.07,0.435 1.47,0.835
3D body: height 2.8, standoff 0, extent -0.635,0 0.635,1.27
3D body: height 7.3, standoff -2.5, extent -0.2,0.435 0.2,0.835
3D body: height 2.8, standoff 0, extent -1.905,-1.27 -0.635,0
3D body: height 7.3, standoff -2.5, extent -1.47,-0.835 -1.07,-0.435
3D body: height 2.8, standoff 0, extent -3.175,-1.27 -1.905,0
3D body: height 7.3, standoff -2.5, extent -2.74,-0.835 -2.34,-0.435
3D body: height 2.8, standoff 0, extent -1.905,0 -0.635,1.27
3D body: height 7.3, standoff -2.5, extent -1.47,0.435 -1.07,0.835
3D body: height 2.8, standoff 0, extent -3.175,0 -1.905,1.27
3D body: height 7.3, standoff -2.5, extent -2.74,0.435 -2.34,0.835
3D body: height 2.8, standoff 0, extent -4.445,-1.27 -3.175,0
3D body: height 7.3, standoff -2.5, extent -4.01,-0.835 -3.61,-0.435
3D body: height 2.8, standoff 0, extent -5.715,-1.27 -4.445,0
3D body: height 7.3, standoff -2.5, extent -5.28,-0.835 -4.88,-0.435
3D body: height 2.8, standoff 0, extent -4.445,0 -3.175,1.27
3D body: height 7.3, standoff -2.5, extent -4.01,0.435 -3.61,0.835
3D body: height 2.8, standoff 0, extent -5.715,0 -4.445,1.27
3D body: height 7.3, standoff -2.5, extent -5.28,0.435 -4.88,0.835
3D body: height 2.8, standoff 0, extent -6.985,-1.27 -5.715,0
3D body: height 7.3, standoff -2.5, extent -6.55,-0.835 -6.15,-0.435
3D body: height 2.8, standoff 0, extent -8.255,-1.27 -6.985,0
3D body: height 7.3, standoff -2.5, extent -7.82,-0.835 -7.42,-0.435
3D body: height 2.8, standoff 0, extent -6.985,0 -5.715,1.27
3D body: height 7.3, standoff -2.5, extent -6.55,0.435 -6.15,0.835
3D body: height 2.8, standoff 0, extent -8.255,0 -6.985,1.27
3D body: height 7.3, standoff -2.5, extent -7.82,0.435 -7.42,0.835
3D body: height 2.8, standoff 0, extent -9.525,-1.27 -8.255,0
3D body: height 7.3, standoff -2.5, extent -9.09,-0.835 -8.69,-0.435
3D body: height 2.8, standoff 0, extent -10.795,-1.27 -9.525,0
3D body: height 7.3, standoff -2.5, extent -10.36,-0.835 -9.96,-0.435
3D body: height 2.8, standoff 0, extent -9.525,0 -8.255,1.27
3D body: height 7.3, standoff -2.5, extent -9.09,0.435 -8.69,0.835
3D body: height 2.8, standoff 0, extent -10.795,0 -9.525,1.27
3D body: height 7.3, standoff -2.5, extent -10.36,0.435 -9.96,0.835

## HDRMINI_M_2X18 [mm] "mini header (50mil pitch)"
pads (36):
  round 1 hole 0.7 mask+0.05: 1(-10.795,-0.635) 2(-10.795,0.635) 3(-9.525,-0.635) 4(-9.525,0.635) 5(-8.255,-0.635) 6(-8.255,0.635) 7(-6.985,-0.635) 8(-6.985,0.635) 9(-5.715,-0.635) 10(-5.715,0.635) 11(-4.445,-0.635) 12(-4.445,0.635) 13(-3.175,-0.635) 14(-3.175,0.635) 15(-1.905,-0.635) 16(-1.905,0.635) 17(-0.635,-0.635) 18(-0.635,0.635) 19(0.635,-0.635) 20(0.635,0.635) 21(1.905,-0.635) 22(1.905,0.635) 23(3.175,-0.635) 24(3.175,0.635) 25(4.445,-0.635) 26(4.445,0.635) 27(5.715,-0.635) 28(5.715,0.635) 29(6.985,-0.635) 30(6.985,0.635) 31(8.255,-0.635) 32(8.255,0.635) 33(9.525,-0.635) 34(9.525,0.635) 35(10.795,-0.635) 36(10.795,0.635)
Top Overlay:
  circle w0.2: c-11.938,-0.635 r0.2
  lines w0.2: -11.331,-0.035 -11.43,-0.2 -11.43,-1.27 -11.331,-1.435 -10.259,-1.435 -10.16,-1.27 -10.061,-1.435 -8.989,-1.435 -8.89,-1.27 -8.791,-1.435 -7.719,-1.435 -7.62,-1.27 -7.521,-1.435 -6.449,-1.435 -6.35,-1.27 -6.251,-1.435 -5.179,-1.435 -5.08,-1.27 -4.981,-1.435 -3.909,-1.435 -3.81,-1.27 -3.711,-1.435 -2.639,-1.435 -2.54,-1.27 -2.441,-1.435 -1.369,-1.435 -1.27,-1.27 -1.171,-1.435 -0.099,-1.435 0,-1.27 0.099,-1.435 1.171,-1.435 1.27,-1.27 1.369,-1.435 2.441,-1.435 2.54,-1.27 2.639,-1.435 3.711,-1.435 3.81,-1.27 3.909,-1.435 4.981,-1.435 5.08,-1.27 5.179,-1.435 6.251,-1.435 6.35,-1.27 6.449,-1.435 7.521,-1.435 7.62,-1.27 7.719,-1.435 8.791,-1.435 8.89,-1.27 8.989,-1.435 10.061,-1.435 10.16,-1.27 10.259,-1.435 11.331,-1.435 11.43,-1.27 11.43,-0.2 11.331,-0.035 ; -11.331,0.035 -11.43,0.2 -11.43,1.27 -11.331,1.435 -10.259,1.435 -10.16,1.27 -10.061,1.435 -8.989,1.435 -8.89,1.27 -8.791,1.435 -7.719,1.435 -7.62,1.27 -7.521,1.435 -6.449,1.435 -6.35,1.27 -6.251,1.435 -5.179,1.435 -5.08,1.27 -4.981,1.435 -3.909,1.435 -3.81,1.27 -3.711,1.435 -2.639,1.435 -2.54,1.27 -2.441,1.435 -1.369,1.435 -1.27,1.27 -1.171,1.435 -0.099,1.435 0,1.27 0.099,1.435 1.171,1.435 1.27,1.27 1.369,1.435 2.441,1.435 2.54,1.27 2.639,1.435 3.711,1.435 3.81,1.27 3.909,1.435 4.981,1.435 5.08,1.27 5.179,1.435 6.251,1.435 6.35,1.27 6.449,1.435 7.521,1.435 7.62,1.27 7.719,1.435 8.791,1.435 8.89,1.27 8.989,1.435 10.061,1.435 10.16,1.27 10.259,1.435 11.331,1.435 11.43,1.27 11.43,0.2 11.331,0.035
3D body: height 2.8, standoff 0, extent 10.16,-1.27 11.43,0
3D body: height 7.3, standoff -2.5, extent 10.595,-0.835 10.995,-0.435
3D body: height 2.8, standoff 0, extent 8.89,-1.27 10.16,0
3D body: height 7.3, standoff -2.5, extent 9.325,-0.835 9.725,-0.435
3D body: height 2.8, standoff 0, extent 10.16,0 11.43,1.27
3D body: height 7.3, standoff -2.5, extent 10.595,0.435 10.995,0.835
3D body: height 2.8, standoff 0, extent 8.89,0 10.16,1.27
3D body: height 7.3, standoff -2.5, extent 9.325,0.435 9.725,0.835
3D body: height 2.8, standoff 0, extent 7.62,-1.27 8.89,0
3D body: height 7.3, standoff -2.5, extent 8.055,-0.835 8.455,-0.435
3D body: height 2.8, standoff 0, extent 6.35,-1.27 7.62,0
3D body: height 7.3, standoff -2.5, extent 6.785,-0.835 7.185,-0.435
3D body: height 2.8, standoff 0, extent 7.62,0 8.89,1.27
3D body: height 7.3, standoff -2.5, extent 8.055,0.435 8.455,0.835
3D body: height 2.8, standoff 0, extent 6.35,0 7.62,1.27
3D body: height 7.3, standoff -2.5, extent 6.785,0.435 7.185,0.835
3D body: height 2.8, standoff 0, extent 5.08,-1.27 6.35,0
3D body: height 7.3, standoff -2.5, extent 5.515,-0.835 5.915,-0.435
3D body: height 2.8, standoff 0, extent 3.81,-1.27 5.08,0
3D body: height 7.3, standoff -2.5, extent 4.245,-0.835 4.645,-0.435
3D body: height 2.8, standoff 0, extent 5.08,0 6.35,1.27
3D body: height 7.3, standoff -2.5, extent 5.515,0.435 5.915,0.835
3D body: height 2.8, standoff 0, extent 3.81,0 5.08,1.27
3D body: height 7.3, standoff -2.5, extent 4.245,0.435 4.645,0.835
3D body: height 2.8, standoff 0, extent 2.54,-1.27 3.81,0
3D body: height 7.3, standoff -2.5, extent 2.975,-0.835 3.375,-0.435
3D body: height 2.8, standoff 0, extent 1.27,-1.27 2.54,0
3D body: height 7.3, standoff -2.5, extent 1.705,-0.835 2.105,-0.435
3D body: height 2.8, standoff 0, extent 2.54,0 3.81,1.27
3D body: height 7.3, standoff -2.5, extent 2.975,0.435 3.375,0.835
3D body: height 2.8, standoff 0, extent 1.27,0 2.54,1.27
3D body: height 7.3, standoff -2.5, extent 1.705,0.435 2.105,0.835
3D body: height 2.8, standoff 0, extent 0,-1.27 1.27,0
3D body: height 7.3, standoff -2.5, extent 0.435,-0.835 0.835,-0.435
3D body: height 2.8, standoff 0, extent -1.27,-1.27 0,0
3D body: height 7.3, standoff -2.5, extent -0.835,-0.835 -0.435,-0.435
3D body: height 2.8, standoff 0, extent 0,0 1.27,1.27
3D body: height 7.3, standoff -2.5, extent 0.435,0.435 0.835,0.835
3D body: height 2.8, standoff 0, extent -1.27,0 0,1.27
3D body: height 7.3, standoff -2.5, extent -0.835,0.435 -0.435,0.835
3D body: height 2.8, standoff 0, extent -2.54,-1.27 -1.27,0
3D body: height 7.3, standoff -2.5, extent -2.105,-0.835 -1.705,-0.435
3D body: height 2.8, standoff 0, extent -3.81,-1.27 -2.54,0
3D body: height 7.3, standoff -2.5, extent -3.375,-0.835 -2.975,-0.435
3D body: height 2.8, standoff 0, extent -2.54,0 -1.27,1.27
3D body: height 7.3, standoff -2.5, extent -2.105,0.435 -1.705,0.835
3D body: height 2.8, standoff 0, extent -3.81,0 -2.54,1.27
3D body: height 7.3, standoff -2.5, extent -3.375,0.435 -2.975,0.835
3D body: height 2.8, standoff 0, extent -5.08,-1.27 -3.81,0
3D body: height 7.3, standoff -2.5, extent -4.645,-0.835 -4.245,-0.435
3D body: height 2.8, standoff 0, extent -6.35,-1.27 -5.08,0
3D body: height 7.3, standoff -2.5, extent -5.915,-0.835 -5.515,-0.435
3D body: height 2.8, standoff 0, extent -5.08,0 -3.81,1.27
3D body: height 7.3, standoff -2.5, extent -4.645,0.435 -4.245,0.835
3D body: height 2.8, standoff 0, extent -6.35,0 -5.08,1.27
3D body: height 7.3, standoff -2.5, extent -5.915,0.435 -5.515,0.835
3D body: height 2.8, standoff 0, extent -7.62,-1.27 -6.35,0
3D body: height 7.3, standoff -2.5, extent -7.185,-0.835 -6.785,-0.435
3D body: height 2.8, standoff 0, extent -8.89,-1.27 -7.62,0
3D body: height 7.3, standoff -2.5, extent -8.455,-0.835 -8.055,-0.435
3D body: height 2.8, standoff 0, extent -7.62,0 -6.35,1.27
3D body: height 7.3, standoff -2.5, extent -7.185,0.435 -6.785,0.835
3D body: height 2.8, standoff 0, extent -8.89,0 -7.62,1.27
3D body: height 7.3, standoff -2.5, extent -8.455,0.435 -8.055,0.835
3D body: height 2.8, standoff 0, extent -10.16,-1.27 -8.89,0
3D body: height 7.3, standoff -2.5, extent -9.725,-0.835 -9.325,-0.435
3D body: height 2.8, standoff 0, extent -11.43,-1.27 -10.16,0
3D body: height 7.3, standoff -2.5, extent -10.995,-0.835 -10.595,-0.435
3D body: height 2.8, standoff 0, extent -10.16,0 -8.89,1.27
3D body: height 7.3, standoff -2.5, extent -9.725,0.435 -9.325,0.835
3D body: height 2.8, standoff 0, extent -11.43,0 -10.16,1.27
3D body: height 7.3, standoff -2.5, extent -10.995,0.435 -10.595,0.835

## HDRMINI_M_2X19 [mm] "mini header (50mil pitch)"
pads (38):
  round 1 hole 0.7 mask+0.05: 1(-11.43,-0.635) 2(-11.43,0.635) 3(-10.16,-0.635) 4(-10.16,0.635) 5(-8.89,-0.635) 6(-8.89,0.635) 7(-7.62,-0.635) 8(-7.62,0.635) 9(-6.35,-0.635) 10(-6.35,0.635) 11(-5.08,-0.635) 12(-5.08,0.635) 13(-3.81,-0.635) 14(-3.81,0.635) 15(-2.54,-0.635) 16(-2.54,0.635) 17(-1.27,-0.635) 18(-1.27,0.635) 19(0,-0.635) 20(0,0.635) 21(1.27,-0.635) 22(1.27,0.635) 23(2.54,-0.635) 24(2.54,0.635) 25(3.81,-0.635) 26(3.81,0.635) 27(5.08,-0.635) 28(5.08,0.635) 29(6.35,-0.635) 30(6.35,0.635) 31(7.62,-0.635) 32(7.62,0.635) 33(8.89,-0.635) 34(8.89,0.635) 35(10.16,-0.635) 36(10.16,0.635) 37(11.43,-0.635) 38(11.43,0.635)
Top Overlay:
  circle w0.2: c-12.573,-0.635 r0.2
  lines w0.2: -11.966,-0.035 -12.065,-0.2 -12.065,-1.27 -11.966,-1.435 -10.894,-1.435 -10.795,-1.27 -10.696,-1.435 -9.624,-1.435 -9.525,-1.27 -9.426,-1.435 -8.354,-1.435 -8.255,-1.27 -8.156,-1.435 -7.084,-1.435 -6.985,-1.27 -6.886,-1.435 -5.814,-1.435 -5.715,-1.27 -5.616,-1.435 -4.544,-1.435 -4.445,-1.27 -4.346,-1.435 -3.274,-1.435 -3.175,-1.27 -3.076,-1.435 -2.004,-1.435 -1.905,-1.27 -1.806,-1.435 -0.734,-1.435 -0.635,-1.27 -0.536,-1.435 0.536,-1.435 0.635,-1.27 0.734,-1.435 1.806,-1.435 1.905,-1.27 2.004,-1.435 3.076,-1.435 3.175,-1.27 3.274,-1.435 4.346,-1.435 4.445,-1.27 4.544,-1.435 5.616,-1.435 5.715,-1.27 5.814,-1.435 6.886,-1.435 6.985,-1.27 7.084,-1.435 8.156,-1.435 8.255,-1.27 8.354,-1.435 9.426,-1.435 9.525,-1.27 9.624,-1.435 10.696,-1.435 10.795,-1.27 10.894,-1.435 11.966,-1.435 12.065,-1.27 12.065,-0.2 11.966,-0.035 ; -11.966,0.035 -12.065,0.2 -12.065,1.27 -11.966,1.435 -10.894,1.435 -10.795,1.27 -10.696,1.435 -9.624,1.435 -9.525,1.27 -9.426,1.435 -8.354,1.435 -8.255,1.27 -8.156,1.435 -7.084,1.435 -6.985,1.27 -6.886,1.435 -5.814,1.435 -5.715,1.27 -5.616,1.435 -4.544,1.435 -4.445,1.27 -4.346,1.435 -3.274,1.435 -3.175,1.27 -3.076,1.435 -2.004,1.435 -1.905,1.27 -1.806,1.435 -0.734,1.435 -0.635,1.27 -0.536,1.435 0.536,1.435 0.635,1.27 0.734,1.435 1.806,1.435 1.905,1.27 2.004,1.435 3.076,1.435 3.175,1.27 3.274,1.435 4.346,1.435 4.445,1.27 4.544,1.435 5.616,1.435 5.715,1.27 5.814,1.435 6.886,1.435 6.985,1.27 7.084,1.435 8.156,1.435 8.255,1.27 8.354,1.435 9.426,1.435 9.525,1.27 9.624,1.435 10.696,1.435 10.795,1.27 10.894,1.435 11.966,1.435 12.065,1.27 12.065,0.2 11.966,0.035
3D body: height 2.8, standoff 0, extent 10.795,-1.27 12.065,0
3D body: height 7.3, standoff -2.5, extent 11.23,-0.835 11.63,-0.435
3D body: height 2.8, standoff 0, extent 10.795,0 12.065,1.27
3D body: height 7.3, standoff -2.5, extent 11.23,0.435 11.63,0.835
3D body: height 2.8, standoff 0, extent 9.525,-1.27 10.795,0
3D body: height 7.3, standoff -2.5, extent 9.96,-0.835 10.36,-0.435
3D body: height 2.8, standoff 0, extent 8.255,-1.27 9.525,0
3D body: height 7.3, standoff -2.5, extent 8.69,-0.835 9.09,-0.435
3D body: height 2.8, standoff 0, extent 9.525,0 10.795,1.27
3D body: height 7.3, standoff -2.5, extent 9.96,0.435 10.36,0.835
3D body: height 2.8, standoff 0, extent 8.255,0 9.525,1.27
3D body: height 7.3, standoff -2.5, extent 8.69,0.435 9.09,0.835
3D body: height 2.8, standoff 0, extent 6.985,-1.27 8.255,0
3D body: height 7.3, standoff -2.5, extent 7.42,-0.835 7.82,-0.435
3D body: height 2.8, standoff 0, extent 5.715,-1.27 6.985,0
3D body: height 7.3, standoff -2.5, extent 6.15,-0.835 6.55,-0.435
3D body: height 2.8, standoff 0, extent 6.985,0 8.255,1.27
3D body: height 7.3, standoff -2.5, extent 7.42,0.435 7.82,0.835
3D body: height 2.8, standoff 0, extent 5.715,0 6.985,1.27
3D body: height 7.3, standoff -2.5, extent 6.15,0.435 6.55,0.835
3D body: height 2.8, standoff 0, extent 4.445,-1.27 5.715,0
3D body: height 7.3, standoff -2.5, extent 4.88,-0.835 5.28,-0.435
3D body: height 2.8, standoff 0, extent 3.175,-1.27 4.445,0
3D body: height 7.3, standoff -2.5, extent 3.61,-0.835 4.01,-0.435
3D body: height 2.8, standoff 0, extent 4.445,0 5.715,1.27
3D body: height 7.3, standoff -2.5, extent 4.88,0.435 5.28,0.835
3D body: height 2.8, standoff 0, extent 3.175,0 4.445,1.27
3D body: height 7.3, standoff -2.5, extent 3.61,0.435 4.01,0.835
3D body: height 2.8, standoff 0, extent 1.905,-1.27 3.175,0
3D body: height 7.3, standoff -2.5, extent 2.34,-0.835 2.74,-0.435
3D body: height 2.8, standoff 0, extent 0.635,-1.27 1.905,0
3D body: height 7.3, standoff -2.5, extent 1.07,-0.835 1.47,-0.435
3D body: height 2.8, standoff 0, extent 1.905,0 3.175,1.27
3D body: height 7.3, standoff -2.5, extent 2.34,0.435 2.74,0.835
3D body: height 2.8, standoff 0, extent 0.635,0 1.905,1.27
3D body: height 7.3, standoff -2.5, extent 1.07,0.435 1.47,0.835
3D body: height 2.8, standoff 0, extent -0.635,-1.27 0.635,0
3D body: height 7.3, standoff -2.5, extent -0.2,-0.835 0.2,-0.435
3D body: height 2.8, standoff 0, extent -1.905,-1.27 -0.635,0
3D body: height 7.3, standoff -2.5, extent -1.47,-0.835 -1.07,-0.435
3D body: height 2.8, standoff 0, extent -0.635,0 0.635,1.27
3D body: height 7.3, standoff -2.5, extent -0.2,0.435 0.2,0.835
3D body: height 2.8, standoff 0, extent -1.905,0 -0.635,1.27
3D body: height 7.3, standoff -2.5, extent -1.47,0.435 -1.07,0.835
3D body: height 2.8, standoff 0, extent -3.175,-1.27 -1.905,0
3D body: height 7.3, standoff -2.5, extent -2.74,-0.835 -2.34,-0.435
3D body: height 2.8, standoff 0, extent -4.445,-1.27 -3.175,0
3D body: height 7.3, standoff -2.5, extent -4.01,-0.835 -3.61,-0.435
3D body: height 2.8, standoff 0, extent -3.175,0 -1.905,1.27
3D body: height 7.3, standoff -2.5, extent -2.74,0.435 -2.34,0.835
3D body: height 2.8, standoff 0, extent -4.445,0 -3.175,1.27
3D body: height 7.3, standoff -2.5, extent -4.01,0.435 -3.61,0.835
3D body: height 2.8, standoff 0, extent -5.715,-1.27 -4.445,0
3D body: height 7.3, standoff -2.5, extent -5.28,-0.835 -4.88,-0.435
3D body: height 2.8, standoff 0, extent -6.985,-1.27 -5.715,0
3D body: height 7.3, standoff -2.5, extent -6.55,-0.835 -6.15,-0.435
3D body: height 2.8, standoff 0, extent -5.715,0 -4.445,1.27
3D body: height 7.3, standoff -2.5, extent -5.28,0.435 -4.88,0.835
3D body: height 2.8, standoff 0, extent -6.985,0 -5.715,1.27
3D body: height 7.3, standoff -2.5, extent -6.55,0.435 -6.15,0.835
3D body: height 2.8, standoff 0, extent -8.255,-1.27 -6.985,0
3D body: height 7.3, standoff -2.5, extent -7.82,-0.835 -7.42,-0.435
3D body: height 2.8, standoff 0, extent -9.525,-1.27 -8.255,0
3D body: height 7.3, standoff -2.5, extent -9.09,-0.835 -8.69,-0.435
3D body: height 2.8, standoff 0, extent -8.255,0 -6.985,1.27
3D body: height 7.3, standoff -2.5, extent -7.82,0.435 -7.42,0.835
3D body: height 2.8, standoff 0, extent -9.525,0 -8.255,1.27
3D body: height 7.3, standoff -2.5, extent -9.09,0.435 -8.69,0.835
3D body: height 2.8, standoff 0, extent -10.795,-1.27 -9.525,0
3D body: height 7.3, standoff -2.5, extent -10.36,-0.835 -9.96,-0.435
3D body: height 2.8, standoff 0, extent -12.065,-1.27 -10.795,0
3D body: height 7.3, standoff -2.5, extent -11.63,-0.835 -11.23,-0.435
3D body: height 2.8, standoff 0, extent -10.795,0 -9.525,1.27
3D body: height 7.3, standoff -2.5, extent -10.36,0.435 -9.96,0.835
3D body: height 2.8, standoff 0, extent -12.065,0 -10.795,1.27
3D body: height 7.3, standoff -2.5, extent -11.63,0.435 -11.23,0.835